# Altium footprint library 1.03-电容.PcbLib: 224 footprints (part 6 of 14)
Each footprint in its own frame and in the unit in brackets; x right, y up, seen from the top. Pads: shape width x height; smd on the part's side, far side on the other; paste and mask are expansions set on the pad; w line width, h text height; cw(c..) or ccw(c..) is an arc to the next point about the centre after c.
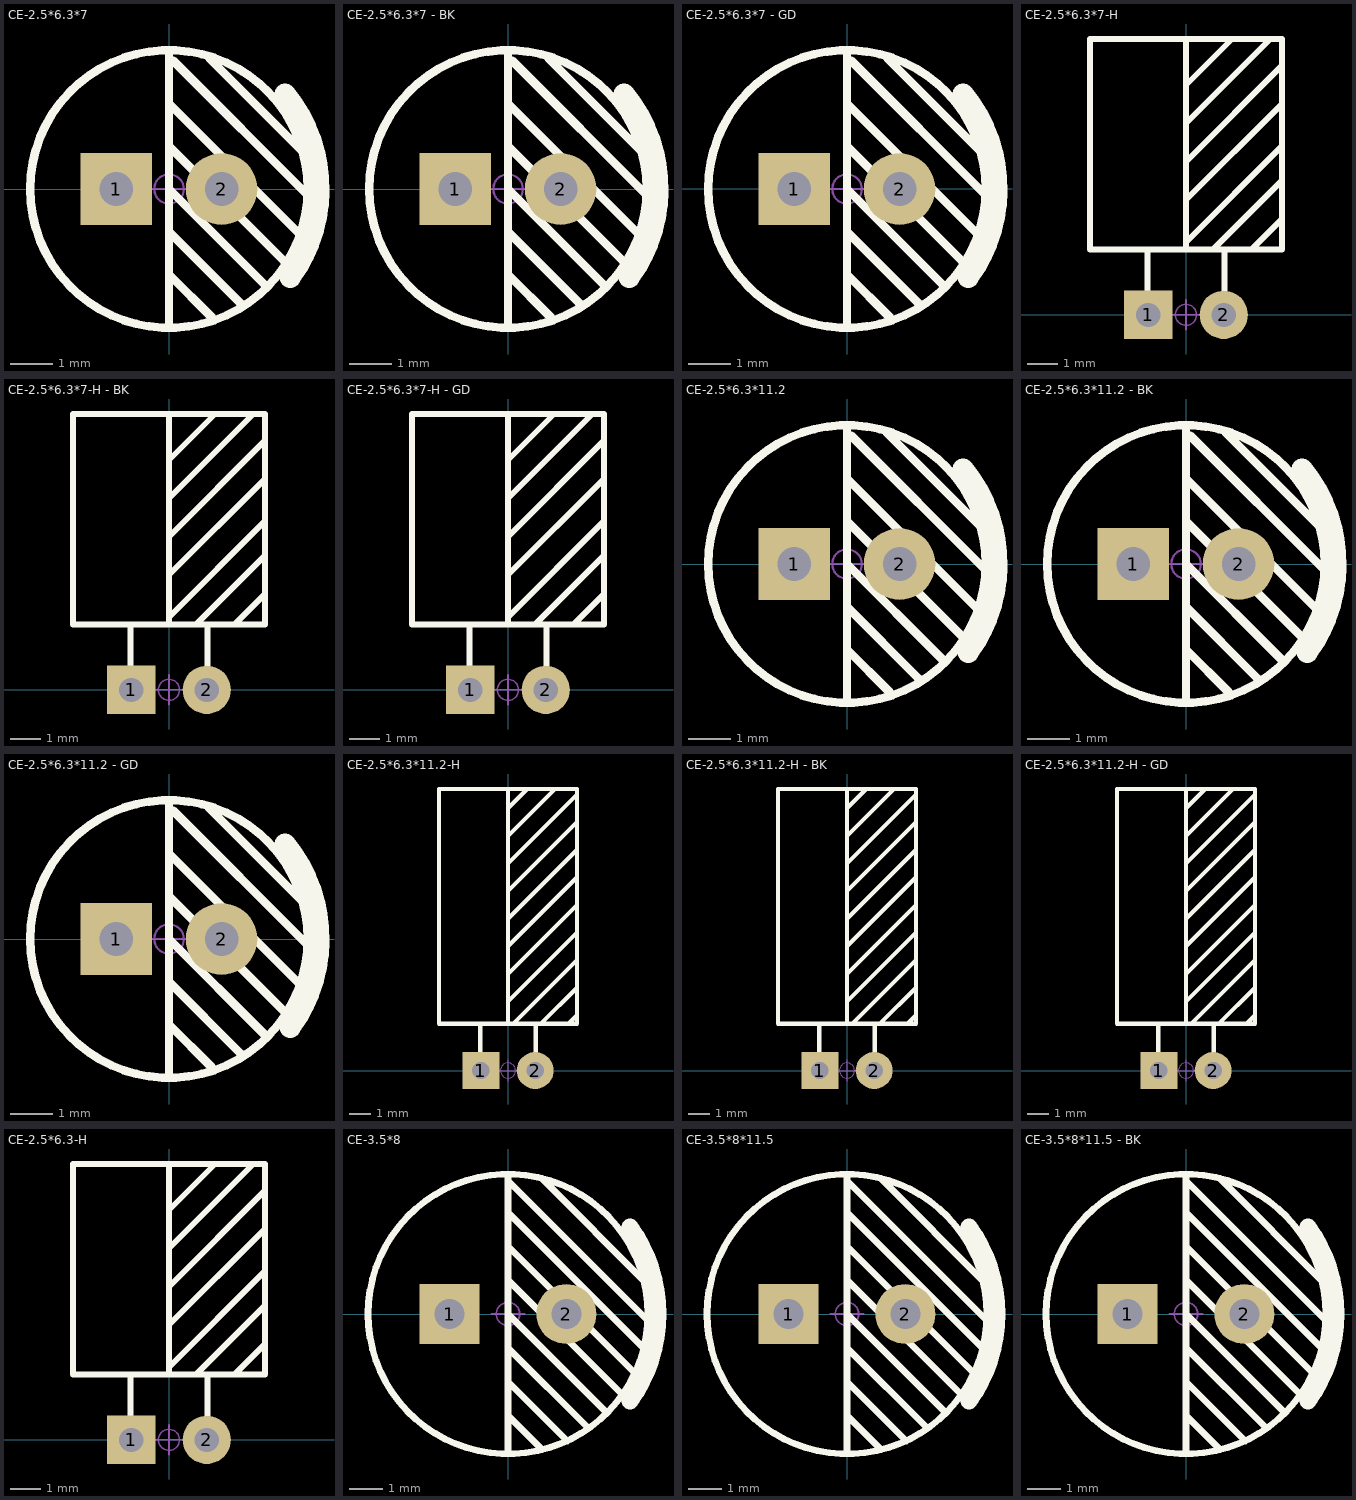
[diagram p5: the footprints below, top view; thin cyan lines are the x and y axes]

## CE-2.5*6.3*7 [mm] "直插电解电容-脚距2.5mm直径6.3mm高度7mm"
pads (2):
  rect 1.7x1.7 hole 0.8: 1(-1.25,0)
  round 1.7 hole 0.8: 2(1.25,0)
Top Overlay:
  circle w0.2: c0,0 r3.3
  lines w0.2: 0,-3.302 0,3.251 ; 0,-2.032 1.029,-3.061 ; 0,-1.016 1.74,-2.756 ; 0,0 2.286,-2.286 ; 0,1.016 2.743,-1.727 2.794,-1.727 ; 0,2.032 3.073,-1.041 ; 0,3.048 0.102,3.048 3.378,-0.228 3.378,-0.305 ; 0.965,3.099 3.124,0.94 3.226,0.94
  lines w0.504: 2.759,2.258 cw(c0,0) 2.883,-2.097
Mechanical 15:
  circle w0.05: c0,0 r0.35
  lines w0.05: -0.5,0 0.5,0 ; 0,-0.5 0,0.5
3D body "CE_TH_2.5x6.3x7-2.STEP": height 7.14, standoff -3.27, extent -3.15,-3.149 3.16,3.15

## CE-2.5*6.3*7 - BK [mm] "直插电解电容-脚距2.5mm直径6.3mm高度7mm"
pads (2):
  rect 1.7x1.7 hole 0.8: 1(-1.25,0)
  round 1.7 hole 0.8: 2(1.25,0)
Top Overlay:
  circle w0.2: c0,0 r3.3
  lines w0.2: 0,-3.302 0,3.251 ; 0,-2.032 1.029,-3.061 ; 0,-1.016 1.74,-2.756 ; 0,0 2.286,-2.286 ; 0,1.016 2.743,-1.727 2.794,-1.727 ; 0,2.032 3.073,-1.041 ; 0,3.048 0.102,3.048 3.378,-0.228 3.378,-0.305 ; 0.965,3.099 3.124,0.94 3.226,0.94
  lines w0.504: 2.759,2.258 cw(c0,0) 2.883,-2.097
Mechanical 15:
  circle w0.05: c0,0 r0.35
  lines w0.05: -0.5,0 0.5,0 ; 0,-0.5 0,0.5
3D body "CE_TH_2_5x6_3x7.STEP": height 7.14, standoff -3.27, extent -3.15,-3.149 3.16,3.15

## CE-2.5*6.3*7 - GD [mm] "直插电解电容-脚距2.5mm直径6.3mm高度7mm"
pads (2):
  rect 1.7x1.7 hole 0.8: 1(-1.25,0)
  round 1.7 hole 0.8: 2(1.25,0)
Top Overlay:
  circle w0.2: c0,0 r3.3
  lines w0.2: 0,-3.302 0,3.251 ; 0,-2.032 1.029,-3.061 ; 0,-1.016 1.74,-2.756 ; 0,0 2.286,-2.286 ; 0,1.016 2.743,-1.727 2.794,-1.727 ; 0,2.032 3.073,-1.041 ; 0,3.048 0.102,3.048 3.378,-0.228 3.378,-0.305 ; 0.965,3.099 3.124,0.94 3.226,0.94
  lines w0.504: 2.759,2.257 cw(c0,0) 2.883,-2.097
Mechanical 15:
  circle w0.05: c0,0 r0.35
  lines w0.05: -0.5,0 0.5,0 ; 0,-0.5 0,0.5
3D body "CE_TH_2_5x6_3x7.STEP": height 7.14, standoff -3.27, extent -3.15,-3.149 3.16,3.15
3D body "LED 0603玻璃罩.": height 0, standoff 0, extent 0,0 0,0

## CE-2.5*6.3*7-H [mm] "直插电解电容-脚距2.5mm直径6.3mm高度7mm"
pads (2):
  rect 1.6x1.6 hole 0.8: 1(-1.25,0)
  round 1.6 hole 0.8: 2(1.25,0)
Top Overlay:
  lines w0.2: -1.27,0.762 -1.27,2.159 ; 0,2.159 0,9.144 ; 0,2.413 3.175,5.588 3.175,5.715 ; 0,3.81 3.175,6.985 ; 0,5.08 3.175,8.255 ; 0,6.35 2.794,9.144 ; 0,7.62 1.524,9.144 ; 0.889,2.159 3.175,4.445 ; 1.27,0.762 1.27,2.159 ; 2.159,2.159 3.175,3.175 ; -3.175,2.159 -3.175,9.144 3.175,9.144 3.175,2.159 -3.175,2.159
Mechanical 15:
  circle w0.05: c0,0 r0.35
  lines w0.05: -0.5,0 0.5,0 ; 0,-0.5 0,0.5
3D body "CAP 2.5X6.3X7-H.STEP": height 6.42, standoff -3.38, extent -3.15,-0.3 3.16,8.91

## CE-2.5*6.3*7-H - BK [mm] "直插电解电容-脚距2.5mm直径6.3mm高度7mm"
pads (2):
  rect 1.6x1.6 hole 0.8: 1(-1.25,0)
  round 1.6 hole 0.8: 2(1.25,0)
Top Overlay:
  lines w0.2: -1.27,0.762 -1.27,2.159 ; 0,2.159 0,9.144 ; 0,2.413 3.175,5.588 3.175,5.715 ; 0,3.81 3.175,6.985 ; 0,5.08 3.175,8.255 ; 0,6.35 2.794,9.144 ; 0,7.62 1.524,9.144 ; 0.889,2.159 3.175,4.445 ; 1.27,0.762 1.27,2.159 ; 2.159,2.159 3.175,3.175 ; -3.175,2.159 -3.175,9.144 3.175,9.144 3.175,2.159 -3.175,2.159
Mechanical 15:
  circle w0.05: c0,0 r0.35
  lines w0.05: -0.5,0 0.5,0 ; 0,-0.5 0,0.5
3D body "CE_TH_2_5x6_3x7-h_.STEP": height 6.43, standoff -3.37, extent -3.15,-0.325 3.16,8.885

## CE-2.5*6.3*7-H - GD [mm] "直插电解电容-脚距2.5mm直径6.3mm高度7mm         淘宝卖家ID:黄晶宝石"
pads (2):
  rect 1.6x1.6 hole 0.8: 1(-1.25,0)
  round 1.6 hole 0.8: 2(1.25,0)
Top Overlay:
  lines w0.2: -1.27,0.762 -1.27,2.159 ; 0,2.159 0,9.144 ; 0,2.413 3.175,5.588 3.175,5.715 ; 0,3.81 3.175,6.985 ; 0,5.08 3.175,8.255 ; 0,6.35 2.794,9.144 ; 0,7.62 1.524,9.144 ; 0.889,2.159 3.175,4.445 ; 1.27,0.762 1.27,2.159 ; 2.159,2.159 3.175,3.175 ; -3.175,2.159 -3.175,9.144 3.175,9.144 3.175,2.159 -3.175,2.159
Mechanical 15:
  circle w0.05: c0,0 r0.35
  lines w0.05: -0.5,0 0.5,0 ; 0,-0.5 0,0.5
3D body "CE_TH_2_5x6_3x7-h.STEP": height 6.43, standoff -3.37, extent -3.155,-0.275 3.155,8.935

## CE-2.5*6.3*11.2 [mm] "直插电解电容-脚距2.5mm直径6.3mm高度11.2mm"
pads (2):
  rect 1.7x1.7 hole 0.8: 1(-1.25,0)
  round 1.7 hole 0.8: 2(1.25,0)
Top Overlay:
  circle w0.2: c0,0 r3.3
  lines w0.2: 0,-3.226 0,3.277 ; 0,-2.032 1.016,-3.048 ; 0,-1.016 1.727,-2.743 ; 0,0 2.299,-2.299 ; 0,1.016 2.769,-1.753 2.87,-1.753 ; 0,2.032 3.099,-1.067 ; 0,3.048 0.102,3.048 3.302,-0.152 ; 0.927,3.137 3.124,0.94 3.2,0.94
  lines w0.504: 2.759,2.258 cw(c0,0) 2.883,-2.097
Mechanical 15:
  circle w0.05: c0,0 r0.35
  lines w0.05: -0.5,0 0.5,0 ; 0,-0.5 0,0.5
3D body "CE_TH_2.5x6.3x11.2-2.stp": height 2.89, standoff -11.72, extent -3.15,-3.149 3.16,3.15

## CE-2.5*6.3*11.2 - BK [mm] "直插电解电容-脚距2.5mm直径6.3mm高度11.2mm"
pads (2):
  rect 1.7x1.7 hole 0.8: 1(-1.25,0)
  round 1.7 hole 0.8: 2(1.25,0)
Top Overlay:
  circle w0.2: c0,0 r3.3
  lines w0.2: 0,-3.226 0,3.277 ; 0,-2.032 1.016,-3.048 ; 0,-1.016 1.727,-2.743 ; 0,0 2.299,-2.299 ; 0,1.016 2.769,-1.753 2.87,-1.753 ; 0,2.032 3.099,-1.067 ; 0,3.048 0.102,3.048 3.302,-0.152 ; 0.927,3.137 3.124,0.94 3.2,0.94
  lines w0.504: 2.759,2.258 cw(c0,0) 2.883,-2.097
Mechanical 15:
  circle w0.05: c0,0 r0.35
  lines w0.05: -0.5,0 0.5,0 ; 0,-0.5 0,0.5
3D body "CE_TH_2_5x6_3x11_2.STEP": height 11.34, standoff -3.27, extent -3.15,-3.149 3.16,3.15

## CE-2.5*6.3*11.2 - GD [mm] "直插电解电容-脚距2.5mm直径6.3mm高度11.2mm"
pads (2):
  rect 1.7x1.7 hole 0.8: 1(-1.25,0)
  round 1.7 hole 0.8: 2(1.25,0)
Top Overlay:
  circle w0.2: c0,0 r3.3
  lines w0.2: 0,-3.226 0,3.277 ; 0,-2.032 1.016,-3.048 ; 0,-1.016 1.727,-2.743 ; 0,0 2.299,-2.299 ; 0,1.016 2.769,-1.753 2.87,-1.753 ; 0,2.032 3.099,-1.067 ; 0,3.048 0.102,3.048 3.302,-0.152 ; 0.927,3.137 3.124,0.94 3.2,0.94
  lines w0.504: 2.759,2.258 cw(c0,0) 2.883,-2.097
Mechanical 15:
  circle w0.05: c0,0 r0.35
  lines w0.05: -0.5,0 0.5,0 ; 0,-0.5 0,0.5
3D body "CE_TH_2_5x6_3x11_2.STEP": height 11.34, standoff -3.27, extent -3.15,-3.149 3.16,3.15

## CE-2.5*6.3*11.2-H [mm] "直插电解电容-脚距2.5mm直径6.3mm高度11.2mm         淘宝卖家ID:黄晶宝石"
pads (2):
  rect 1.7x1.7 hole 0.8: 1(-1.25,0)
  round 1.7 hole 0.8: 2(1.25,0)
Top Overlay:
  lines w0.2: -1.27,0.635 -1.27,2.032 ; 0,2.159 0,12.954 ; 0,3.175 3.175,6.35 ; 0,4.445 3.175,7.62 ; 0,5.715 3.175,8.89 ; 0,6.985 3.175,10.16 ; 0,8.255 3.175,11.43 ; 0,9.525 3.175,12.7 ; 0,10.795 2.159,12.954 ; 0,12.065 0.889,12.954 ; 0.254,2.159 3.175,5.08 3.175,4.953 ; 1.27,0.635 1.27,2.159 ; 1.524,2.159 3.175,3.81 ; 2.794,2.159 3.175,2.54 ; -3.175,2.159 3.175,2.159 3.175,12.954 -3.175,12.954 -3.175,2.159
Mechanical 15:
  circle w0.05: c0,0 r0.35
  lines w0.05: -0.5,0 0.5,0 ; 0,-0.5 0,0.5
3D body "CE_TH_2_5x6_3x11_2-h.STEP": height 6.3, standoff -3.5, extent -3.135,-0.355 3.175,13.055

## CE-2.5*6.3*11.2-H - BK [mm] "直插电解电容-脚距2.5mm直径6.3mm高度11.2mm"
pads (2):
  rect 1.7x1.7 hole 0.8: 1(-1.25,0)
  round 1.7 hole 0.8: 2(1.25,0)
Top Overlay:
  lines w0.2: -1.27,0.635 -1.27,2.032 ; 0,2.159 0,12.954 ; 0,3.175 3.175,6.35 ; 0,4.445 3.175,7.62 ; 0,5.715 3.175,8.89 ; 0,6.985 3.175,10.16 ; 0,8.255 3.175,11.43 ; 0,9.525 3.175,12.7 ; 0,10.795 2.159,12.954 ; 0,12.065 0.889,12.954 ; 0.254,2.159 3.175,5.08 3.175,4.953 ; 1.27,0.635 1.27,2.159 ; 1.524,2.159 3.175,3.81 ; 2.794,2.159 3.175,2.54 ; -3.175,2.159 3.175,2.159 3.175,12.954 -3.175,12.954 -3.175,2.159
Mechanical 15:
  circle w0.05: c0,0 r0.35
  lines w0.05: -0.5,0 0.5,0 ; 0,-0.5 0,0.5
3D body "CE_TH_2_5x6_3x11_2-h.STEP": height 6.45, standoff -3.35, extent -3.08,-0.275 3.23,13.135

## CE-2.5*6.3*11.2-H - GD [mm] "直插电解电容-脚距2.5mm直径6.3mm高度11.2mm"
pads (2):
  rect 1.7x1.7 hole 0.8: 1(-1.25,0)
  round 1.7 hole 0.8: 2(1.25,0)
Top Overlay:
  lines w0.2: -1.27,0.635 -1.27,2.032 ; 0,2.159 0,12.954 ; 0,3.175 3.175,6.35 ; 0,4.445 3.175,7.62 ; 0,5.715 3.175,8.89 ; 0,6.985 3.175,10.16 ; 0,8.255 3.175,11.43 ; 0,9.525 3.175,12.7 ; 0,10.795 2.159,12.954 ; 0,12.065 0.889,12.954 ; 0.254,2.159 3.175,5.08 3.175,4.953 ; 1.27,0.635 1.27,2.159 ; 1.524,2.159 3.175,3.81 ; 2.794,2.159 3.175,2.54 ; -3.175,2.159 -3.175,12.954 3.175,12.954 3.175,2.159 -3.175,2.159
Mechanical 15:
  circle w0.05: c0,0 r0.35
  lines w0.05: -0.5,0 0.5,0 ; 0,-0.5 0,0.5
3D body "CE_TH_2_5x6_3x11_2-h.STEP": height 6.43, standoff -3.37, extent -3.155,-0.35 3.155,13.06

## CE-2.5*6.3-H [mm] "直插电解电容-脚距2.5mm直径6.3mm高度7mm         淘宝卖家ID:黄晶宝石"
pads (2):
  rect 1.6x1.6 hole 0.8: 1(-1.25,0)
  round 1.6 hole 0.8: 2(1.25,0)
Top Overlay:
  lines w0.2: -1.27,0.762 -1.27,2.159 ; 0,2.159 0,9.144 ; 0,2.413 3.175,5.588 3.175,5.715 ; 0,3.81 3.175,6.985 ; 0,5.08 3.175,8.255 ; 0,6.35 2.794,9.144 ; 0,7.62 1.524,9.144 ; 0.889,2.159 3.175,4.445 ; 1.27,0.762 1.27,2.159 ; 2.159,2.159 3.175,3.175 ; -3.175,2.159 3.175,2.159 3.175,9.144 -3.175,9.144 -3.175,2.159
Mechanical 15:
  circle w0.05: c0,0 r0.35
  lines w0.05: -0.5,0 0.5,0 ; 0,-0.5 0,0.5
3D body "CE_TH_2_5x6_3x7-h.STEP": height 6.43, standoff -3.37, extent -3.155,-0.275 3.155,8.935

## CE-3.5*8 [mm] "脚距3.5mm直径8mm高度11.5mm            联系卖家 免费查找封装"
pads (2):
  rect 1.8x1.8 hole 0.9: 1(-1.75,0)
  round 1.8 hole 0.9: 2(1.75,0)
Top Overlay:
  circle w0.2: c0,0 r4.2
  lines w0.2: 0,-4.191 0,4 ; 0,-3.048 1.016,-4.064 ; 0,-2.032 1.778,-3.81 ; 0,-1.016 2.413,-3.429 ; 0,0 2.921,-2.921 ; 0,1.016 3.429,-2.413 ; 0,2.032 3.81,-1.778 ; 0,3.048 4.064,-1.016 ; 0,4.191 0,4 ; 1.016,4.064 4.191,0.889 ; 4.191,-0.127 4.127,-0.127 0,4
  lines w0.504: 3.663,-2.616 ccw(c0,0) 3.663,2.616
Mechanical 15:
  circle w0.05: c0,0 r0.35
  lines w0.05: -0.5,0 0.5,0 ; 0,-0.5 0,0.5
3D body "CE_TH_3_5x8x11_5.STEP": height 11.64, standoff -3.27, extent -4,-3.999 4.01,4

## CE-3.5*8*11.5 [mm] "脚距3.5mm直径8mm高度11.5mm                   联系卖家 免费查找封装"
pads (2):
  rect 1.8x1.8 hole 0.9: 1(-1.75,0)
  round 1.8 hole 0.9: 2(1.75,0)
Top Overlay:
  circle w0.2: c0,0 r4.2
  lines w0.2: 0,-4.191 0,4 ; 0,-3.048 1.016,-4.064 ; 0,-2.032 1.778,-3.81 ; 0,-1.016 2.413,-3.429 ; 0,0 2.921,-2.921 ; 0,1.016 3.429,-2.413 ; 0,2.032 3.81,-1.778 ; 0,3.048 4.064,-1.016 ; 0,4.191 0,4 ; 1.016,4.064 4.191,0.889 ; 4.191,-0.127 4.127,-0.127 0,4
  lines w0.504: 3.663,-2.616 ccw(c0,0) 3.663,2.616
Mechanical 15:
  circle w0.05: c0,0 r0.35
  lines w0.05: -0.5,0 0.5,0 ; 0,-0.5 0,0.5
3D body "CE_TH_3.5x8x11.5.STEP": height 11.64, standoff -3.27, extent -4,-3.999 4.01,4

## CE-3.5*8*11.5 - BK [mm] "脚距3.5mm直径8mm高度11.5mm            联系卖家 免费查找封装"
pads (2):
  rect 1.8x1.8 hole 0.9: 1(-1.75,0)
  round 1.8 hole 0.9: 2(1.75,0)
Top Overlay:
  circle w0.2: c0,0 r4.2
  lines w0.2: 0,-4.191 0,4 ; 0,-3.048 1.016,-4.064 ; 0,-2.032 1.778,-3.81 ; 0,-1.016 2.413,-3.429 ; 0,0 2.921,-2.921 ; 0,1.016 3.429,-2.413 ; 0,2.032 3.81,-1.778 ; 0,3.048 4.064,-1.016 ; 0,4.191 0,4 ; 1.016,4.064 4.191,0.889 ; 4.191,-0.127 4.127,-0.127 0,4
  lines w0.504: 3.663,-2.616 ccw(c0,0) 3.663,2.616
Mechanical 15:
  circle w0.05: c0,0 r0.35
  lines w0.05: -0.5,0 0.5,0 ; 0,-0.5 0,0.5
3D body "CE_TH_3_5x8x11_5.STEP": height 11.64, standoff -3.27, extent -4,-3.999 4.01,4